# Altium footprint library TarabusLibrary.PcbLib: 591 footprints (part 3 of 37)
Each footprint in its own frame and in the unit in brackets; x right, y up, seen from the top. Pads: shape width x height; smd on the part's side, far side on the other; paste and mask are expansions set on the pad; w line width, h text height; cw(c..) or ccw(c..) is an arc to the next point about the centre after c.
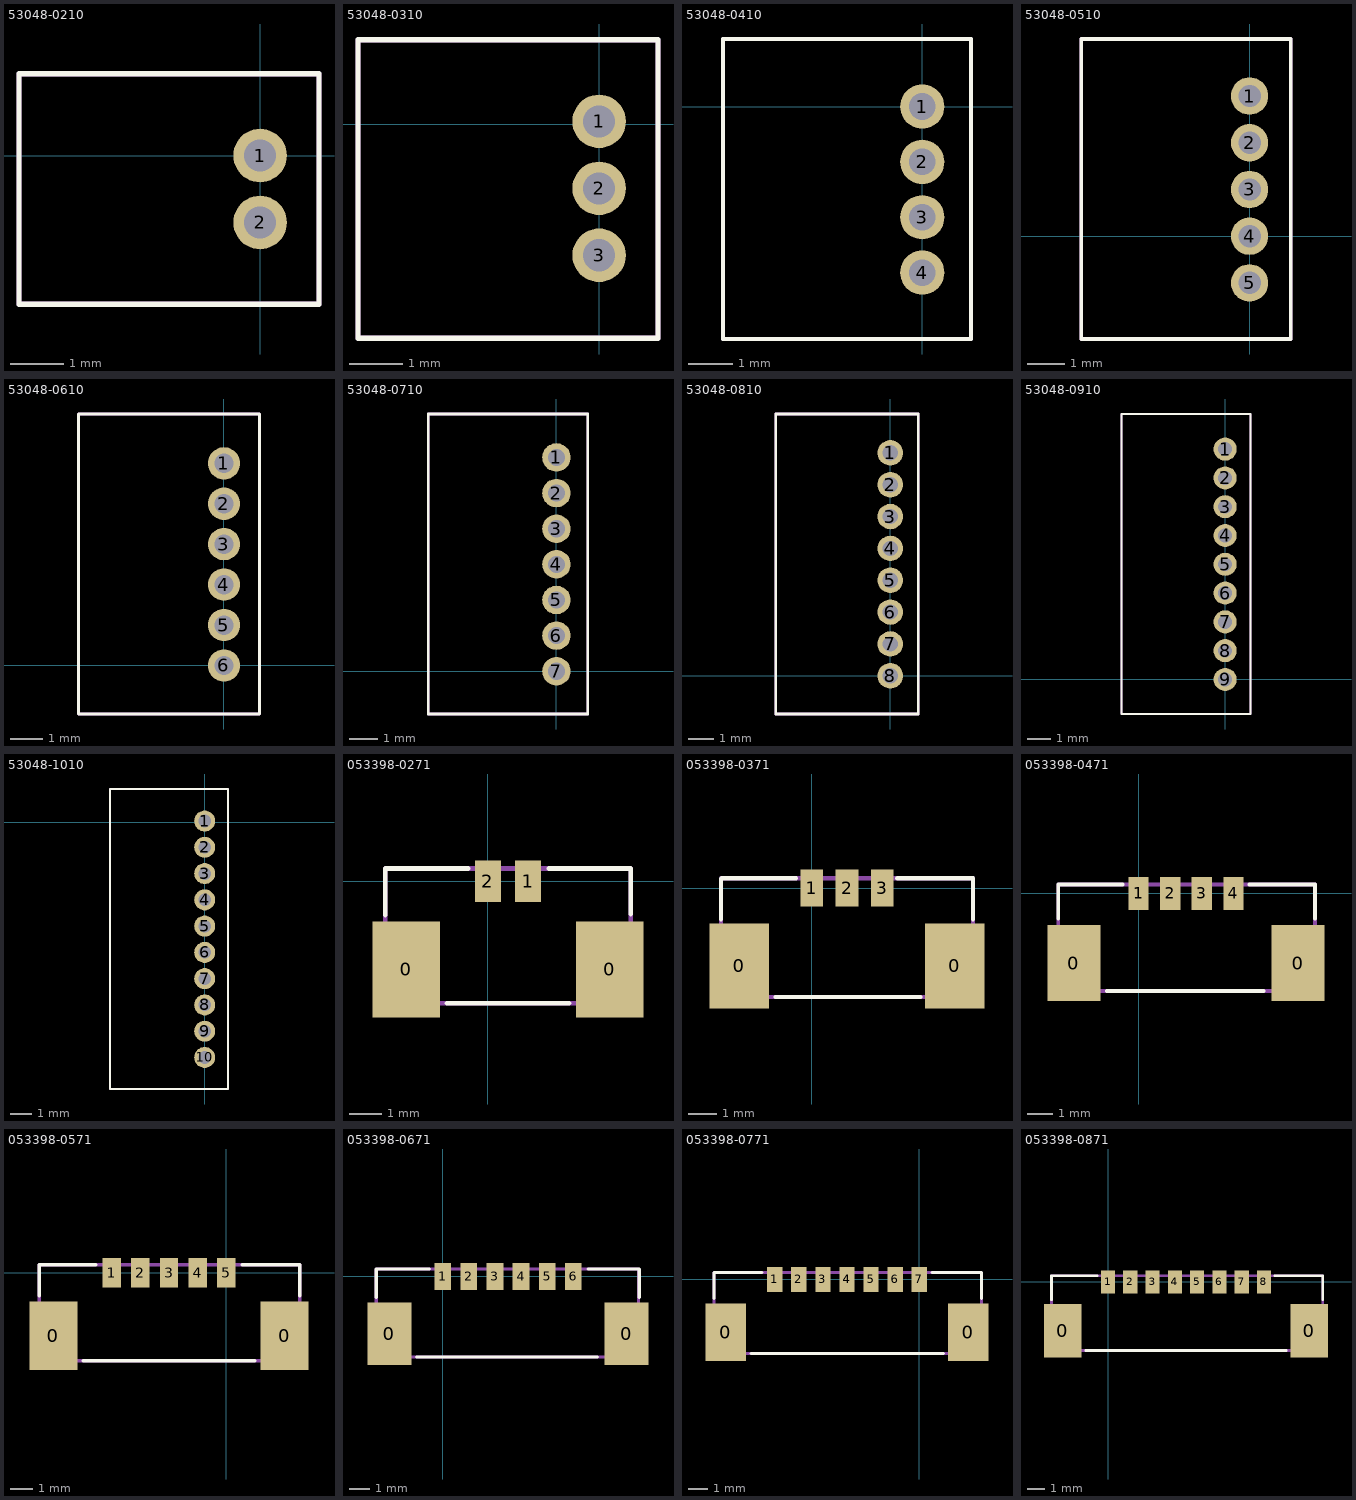
[diagram p2: the footprints below, top view; thin cyan lines are the x and y axes]

## 53048-0210 [mm]
pads (2):
  round 1 hole 0.6 mask+0: 1(0,0) 2(0,-1.25)
Top Overlay:
  lines w0.1: -4.5,-2.775 1.1,-2.775 1.1,1.525 -4.5,1.525 -4.5,-2.775
Mechanical 7:
  lines w0.1: -4.5,-2.775 -4.5,1.525 1.1,1.525 1.1,-2.775 -4.5,-2.775
3D body "User Library-53048-0210.STEP": height 3.5, standoff -2.4, extent -4.45,-2.775 1.05,1.475

## 53048-0310 [mm]
pads (3):
  round 1 hole 0.6 mask+0: 1(0,0.05) 2(0,-1.2) 3(0,-2.45)
Top Overlay:
  lines w0.1: -4.5,-4 1.1,-4 1.1,1.575 -4.5,1.575 -4.5,-4
Mechanical 7:
  lines w0.1: -4.5,-4 -4.5,1.575 1.1,1.575 1.1,-4 -4.5,-4
3D body "5731.stp": height 3.55, standoff -2.25, extent -4.45,-3.95 1.05,1.55

## 53048-0410 [mm]
pads (4):
  round 1 hole 0.6 mask+0: 1(0,0) 2(0,-1.25) 3(0,-2.5) 4(0,-3.75)
Top Overlay:
  lines w0.1: -4.5,-5.25 -4.5,1.525 1.1,1.525 1.1,-5.25 -4.5,-5.25
Mechanical 7:
  lines w0.1: -4.5,-5.25 1.1,-5.25 1.1,1.525 -4.5,1.525 -4.5,-5.25

## 53048-0510 [mm]
pads (5):
  round 1 hole 0.6 mask+0: 1(0,3.75) 2(0,2.5) 3(0,1.25) 4(0,0) 5(0,-1.25)
Top Overlay:
  lines w0.1: -4.5,-2.75 1.1,-2.75 1.1,5.275 -4.5,5.275 -4.5,-2.75
Mechanical 7:
  lines w0.1: -4.5,-2.75 -4.5,5.275 1.1,5.275 1.1,-2.75 -4.5,-2.75

## 53048-0610 [mm]
pads (6):
  round 1 hole 0.6 mask+0: 1(0,6.25) 2(0,5) 3(0,3.75) 4(0,2.5) 5(0,1.25) 6(0,0)
Top Overlay:
  lines w0.1: -4.5,-1.5 -4.5,7.775 1.1,7.775 1.1,-1.5 -4.5,-1.5
Mechanical 7:
  lines w0.1: -4.5,-1.5 1.1,-1.5 1.1,7.775 -4.5,7.775 -4.5,-1.5

## 53048-0710 [mm]
pads (7):
  round 1 hole 0.6 mask+0: 1(0,7.5) 2(0,6.25) 3(0,5) 4(0,3.75) 5(0,2.5) 6(0,1.25) 7(0,0)
Top Overlay:
  lines w0.1: -4.5,-1.5 1.1,-1.5 1.1,9.025 -4.5,9.025 -4.5,-1.5
Mechanical 7:
  lines w0.1: -4.5,-1.5 -4.5,9.025 1.1,9.025 1.1,-1.5 -4.5,-1.5

## 53048-0810 [mm]
pads (8):
  round 1 hole 0.6 mask+0: 1(0,8.75) 2(0,7.5) 3(0,6.25) 4(0,5) 5(0,3.75) 6(0,2.5) 7(0,1.25) 8(0,0)
Top Overlay:
  lines w0.1: -4.5,-1.5 1.1,-1.5 1.1,10.275 -4.5,10.275 -4.5,-1.5
Mechanical 7:
  lines w0.1: -4.5,-1.5 -4.5,10.275 1.1,10.275 1.1,-1.5 -4.5,-1.5

## 53048-0910 [mm]
pads (9):
  round 1 hole 0.6 mask+0: 1(0,10) 2(0,8.75) 3(0,7.5) 4(0,6.25) 5(0,5) 6(0,3.75) 7(0,2.5) 8(0,1.25) 9(0,0)
Top Overlay:
  lines w0.1: -4.5,-1.5 1.1,-1.5 1.1,11.525 -4.5,11.525 -4.5,-1.5
Mechanical 7:
  lines w0.1: -4.5,-1.5 -4.5,11.525 1.1,11.525 1.1,-1.5 -4.5,-1.5

## 53048-1010 [mm]
pads (10):
  round 1 hole 0.6 mask+0: 1(0,0.05) 2(0,-1.2) 3(0,-2.45) 4(0,-3.7) 5(0,-4.95) 6(0,-6.2) 7(0,-7.45) 8(0,-8.7) 9(0,-9.95) 10(0,-11.2)
Top Overlay:
  lines w0.1: -4.5,-12.7 1.1,-12.7 1.1,1.575 -4.5,1.575 -4.5,-12.7
Mechanical 7:
  lines w0.1: -4.5,-12.7 -4.5,1.575 1.1,1.575 1.1,-12.7 -4.5,-12.7
3D body "5738.stp": height 3.55, standoff -2.25, extent -4.45,-12.625 1.05,1.625

## 053398-0271 [mm]
pads (4):
  rect 2.1x3 smd: 0(-2.55,-2.75) 0(3.8,-2.75)
  rect 0.8x1.3 smd: 1(1.25,0) 2(0,0)
Top Overlay:
  lines w0.15: -3.2,-1.05 -3.2,0.4 -0.625,0.4 ; -1.275,-3.8 2.525,-3.8 ; 1.9,0.4 4.45,0.4 4.45,-1.025
Mechanical 7:
  lines w0.15: -3.2,-3.8 4.45,-3.8 4.45,0.4 -3.2,0.4 -3.2,-3.8
Mechanical 10:
  text ".Comment" at 2.5,0.775 h0.6
  text ".Designator" at 2.475,1.35 h0.8
3D body "533980271.stp": height 4.7, standoff 0, extent -3.2,-3.8 4.45,0.4

## 053398-0371 [mm]
pads (5):
  rect 2.1x3 smd: 0(-2.55,-2.75) 0(5.05,-2.75)
  rect 0.8x1.3 smd: 1(0,0) 2(1.25,0) 3(2.5,0)
Top Overlay:
  lines w0.15: -3.2,-1.1 -3.2,0.325 ; -3.175,0.35 -0.55,0.35 ; -1.275,-3.85 3.85,-3.85 ; 3.025,0.35 5.7,0.35 5.7,-1.1
Mechanical 7:
  lines w0.15: -3.2,-3.85 -3.2,0.35 5.7,0.35 5.7,-3.85 -3.2,-3.85
Mechanical 10:
  text ".Comment" at 3.9,0.625 h0.6
  text ".Designator" at 3.875,1.2 h0.8
3D body "533980371.stp": height 4.7, standoff 0, extent -3.2,-3.85 5.7,0.35

## 053398-0471 [mm]
pads (6):
  rect 2.1x3 smd: 0(-2.55,-2.75) 0(6.3,-2.75)
  rect 0.8x1.3 smd: 1(0,0) 2(1.25,0) 3(2.5,0) 4(3.75,0)
Top Overlay:
  lines w0.15: -3.175,-1 -3.175,0.35 -0.625,0.35 ; -1.25,-3.85 4.95,-3.85 ; 4.375,0.35 6.975,0.35 6.975,-1
Mechanical 7:
  lines w0.15: -3.175,-3.85 -3.175,0.35 6.975,0.35 6.975,-3.85 -3.175,-3.85
Mechanical 10:
  text ".Designator" at 5.125,1.75 h0.8
  text ".Comment" at 5.15,1.175 h0.6
3D body "533980471.stp": height 4.7, standoff 0, extent -3.15,-3.875 7,0.325

## 053398-0571 [mm]
pads (7):
  rect 2.1x3 smd: 0(-7.55,-2.75) 0(2.55,-2.75)
  rect 0.8x1.3 smd: 1(-5,0) 2(-3.75,0) 3(-2.5,0) 4(-1.25,0) 5(0,0)
Top Overlay:
  lines w0.15: -8.175,-1 -8.175,0.35 -5.7,0.35 ; -6.25,-3.85 1.25,-3.85 ; 0.7,0.35 3.2,0.35 3.2,-1
Mechanical 7:
  lines w0.15: -8.175,-3.85 -8.175,0.35 3.2,0.35 3.2,-3.85 -8.175,-3.85
Mechanical 10:
  text ".Designator" at 0.125,1.75 h0.8
  text ".Comment" at 0.15,1.175 h0.6

## 053398-0671 [mm]
pads (8):
  rect 2.1x3 smd: 0(-2.55,-2.75) 0(8.8,-2.75)
  rect 0.8x1.3 smd: 1(0,0) 2(1.25,0) 3(2.5,0) 4(3.75,0) 5(5,0) 6(6.25,0)
Top Overlay:
  lines w0.15: -3.175,-1 -3.175,0.35 -0.625,0.35 ; -1.25,-3.85 7.4,-3.85 ; 6.95,0.35 9.4,0.35 9.4,-1
Mechanical 7:
  lines w0.15: -3.175,-3.85 9.375,-3.85 9.375,0.35 -3.175,0.35 -3.175,-3.85
Mechanical 10:
  text ".Comment" at 5.15,1.175 h0.6
  text ".Designator" at 5.125,1.75 h0.8
3D body "533980671.stp": height 4.7, standoff 0, extent -3.225,-3.825 9.425,0.375

## 053398-0771 [mm]
pads (10):
  rect 2.1x3 smd: 0(-10.05,-2.75) 0(2.55,-2.75)
  rect 0.8x1.3 smd: 1(-7.5,0) 2(-6.25,0) 3(-5,0) 4(-3.75,0) 4(-3.75,0) 5(-2.5,0) 6(-1.25,0) 7(0,0)
Top Overlay:
  lines w0.15: -10.675,-1 -10.675,0.35 -8.175,0.35 ; -8.75,-3.85 1.275,-3.85 ; 0.675,0.35 3.25,0.35 3.25,-1
Mechanical 7:
  lines w0.15: -10.675,-3.85 -10.675,0.35 3.25,0.35 3.25,-3.85 -10.675,-3.85
Mechanical 10:
  text ".Designator" at -2.375,1.75 h0.8
  text ".Comment" at -2.35,1.175 h0.6

## 053398-0871 [mm]
pads (11):
  rect 2.1x3 smd: 0(-2.55,-2.75) 0(11.3,-2.75)
  rect 0.8x1.3 smd: 1(0,0) 2(1.25,0) 3(2.5,0) 4(3.75,0) 4(3.75,0) 5(5,0) 6(6.25,0) 7(7.5,0) 8(8.75,0)
Top Overlay:
  lines w0.15: -3.175,-1 -3.175,0.35 -0.625,0.35 ; -1.25,-3.85 10,-3.85 ; 9.375,0.35 12.05,0.35 12.05,-1
Mechanical 7:
  lines w0.15: -3.175,-3.85 -3.175,0.35 12.05,0.35 12.05,-3.85 -3.175,-3.85
Mechanical 10:
  text ".Designator" at 5.125,1.75 h0.8
  text ".Comment" at 5.15,1.175 h0.6
3D body "533980871.stp": height 4.7, standoff 0, extent -3.1,-3.875 12.05,0.325